# Altium integrated library MU_MP_39_V1.IntLib: 148 symbols (part 2 of 2)
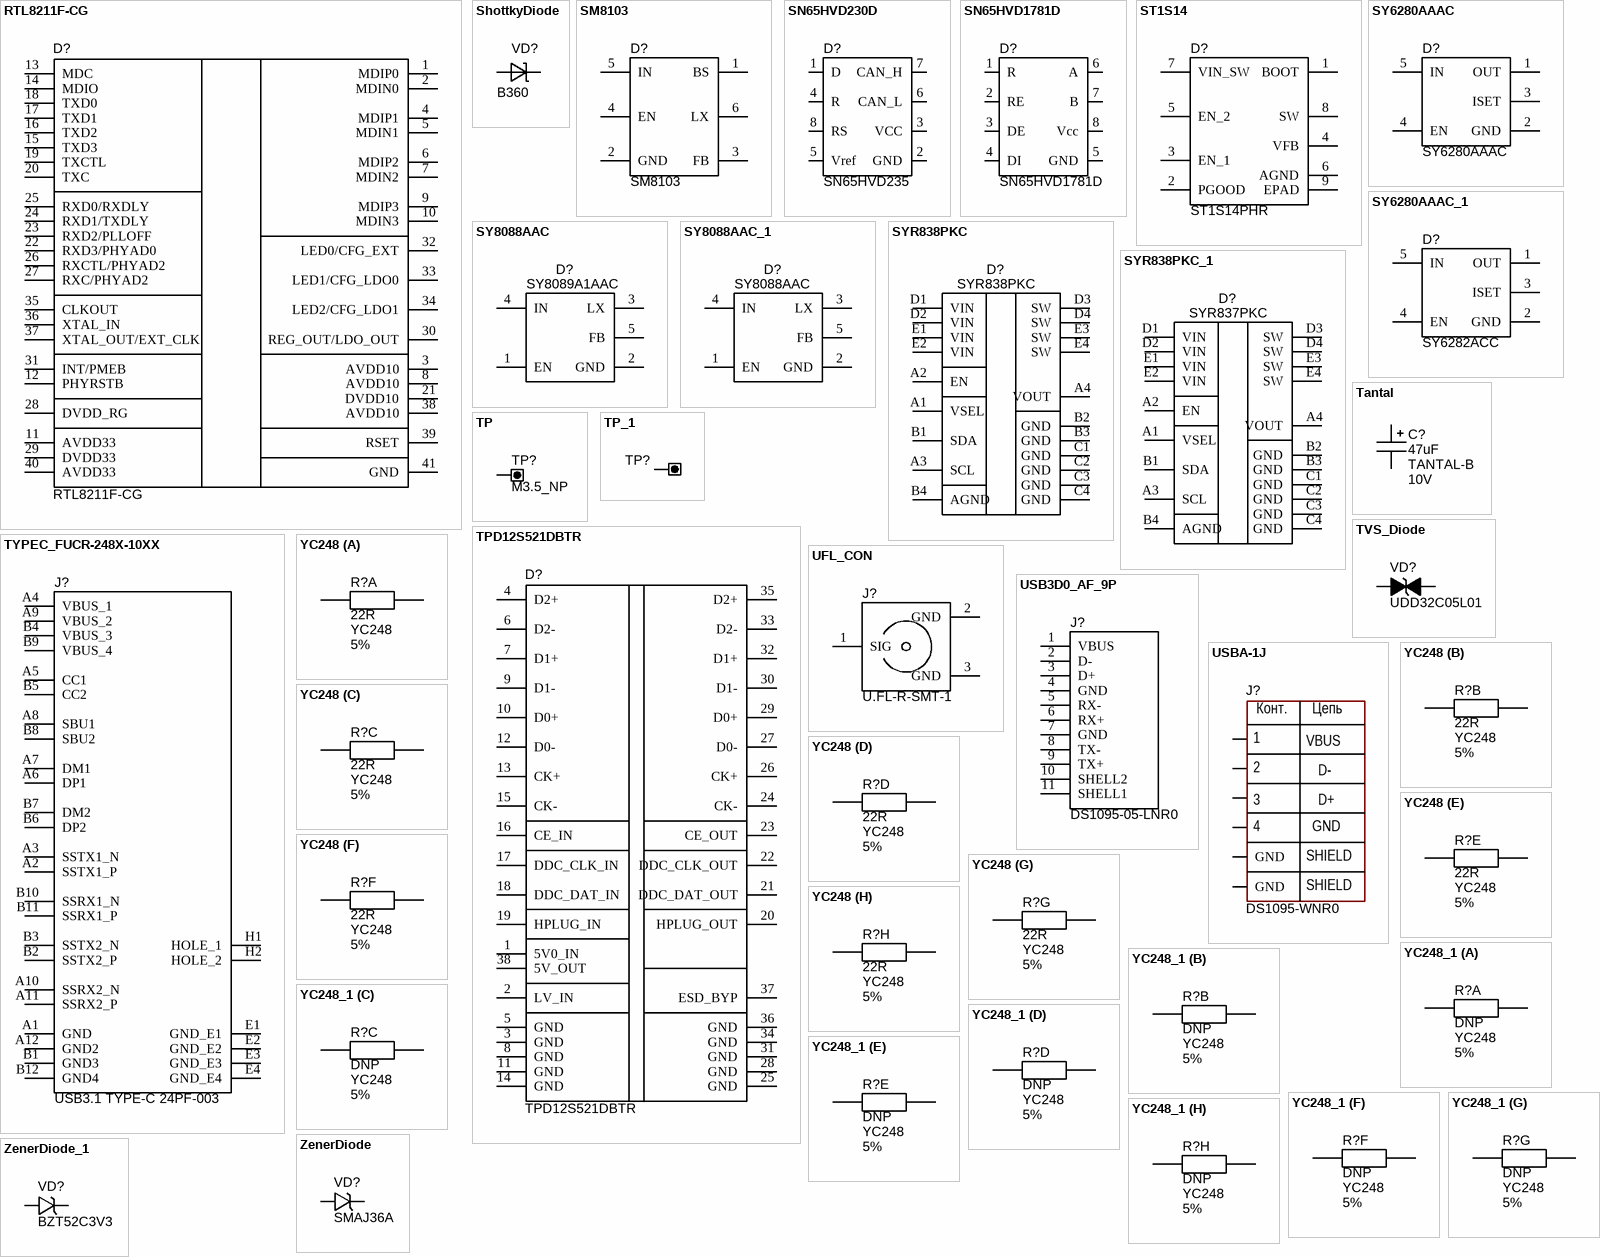
[diagram p14: symbols RTL8211F-CG to ZenerDiode_1]

## TYPEC_FUCR-248X-10XX
designator J?, comment USB3.1 TYPE-C 24PF-003
ComponentType: SMD Chip Resistor; Manufacter: *; Voltage: *; ClassName: *; Tolerance: *; PartNumber: USB3.1 TYPE-C 24PF-003; Package: USB3.1 TYPE-C 24PF-003; Value: USB3.1 TYPE-C 24PF-003
footprint USB3.1 TYPE-C 24PF-003
pins: A1 GND, A2 SSTX1_P, A3 SSTX1_N, A4 VBUS_1, A5 CC1, A6 DP1, A7 DM1, A8 SBU1, A9 VBUS_2, A10 SSRX2_N, A11 SSRX2_P, A12 GND2, B1 GND3, B2 SSTX2_P, B3 SSTX2_N, B4 VBUS_3, B5 CC2, B6 DP2, B7 DM2, B8 SBU2, B9 VBUS_4, B10 SSRX1_N, B11 SSRX1_P, B12 GND4, E1 GND_E1, E2 GND_E2, E3 GND_E3, E4 GND_E4, H1 HOLE_1, H2 HOLE_2

## UFL_CON
designator J?, comment U.FL-R-SMT-1
ComponentType: SMD Chip Resistor; Manufacter: *; Voltage: *; ClassName: *; Tolerance: *; PartNumber: U.FL-R-SMT-1; Package: U.FL-R-SMT-1; Value: U.FL-R-SMT-1
footprint U.FL-R-SMT-1
pins: 1 SIG, 2 GND, 3 GND

## USB3D0_AF_9P
designator J?, comment DS1095-05-LNR0
ComponentType: SMD Chip Resistor; Manufacter: *; Voltage: *; ClassName: *; Tolerance: *; PartNumber: DS1095-05-LNR0; Package: DS1095-05-LNR0; Value: DS1095-05-LNR0
footprint DS1095-05-LNR0
pins: 1 VBUS, 2 D-, 3 D+, 4 GND, 5 RX-, 6 RX+, 7 GND, 8 TX-, 9 TX+, 10 SHELL2, 11 SHELL1

## USBA-1J
designator J?, comment DS1095-WNR0
ComponentType: *; Manufacter: *; Package: DS1095-WNR0; PartNumber: DS1095-WNR0; Value: DS1095-WNR0
footprint USB-A-J1
footprint DS1095-WNR0
pins: 1, 2, 3, 4, S1 GND, S2 GND
text: Конт.; Цепь; VBUS; D-; D+; SHIELD

## YC248
designator R?, comment Package: YC248  Tolerance: 5%  (hidden comment: 22R)
PartNumber: YC248-JR-0722RL; ComponentType: *; Manufacter: *; ClassName: *; Value: 22R
footprint YC248
part A pins: 1, 16
part B pins: 2, 15
part C pins: 3, 14
part D pins: 4, 13
part E pins: 5, 12
part F pins: 6, 11
part G pins: 7, 10
part H pins: 8, 9

## YC248_1
designator R?, comment Package: YC248  Tolerance: 5%  (hidden comment: DNP)
PartNumber: Do Not Place; ComponentType: *; Manufacter: *; ClassName: *; Value: DNP
footprint YC248
part A pins: 1, 16
part B pins: 2, 15
part C pins: 3, 14
part D pins: 4, 13
part E pins: 5, 12
part F pins: 6, 11
part G pins: 7, 10
part H pins: 8, 9

## ZenerDiode
designator VD?, comment SMAJ36A
ComponentType: *; Manufacter: *; Package: SMA; PartNumber: SMAJ36A; ClassName: *; Value: SMAJ36A
footprint SOD323
footprint SMC
footprint SMA
pins: 1 A, 2 C

## ZenerDiode_1
designator VD?, comment BZT52C3V3
ComponentType: *; Manufacter: *; Package: SOD323; PartNumber: BZT52C3V3; ClassName: *; Value: BZT52C3V3
footprint SOD323
footprint SMC
pins: 1 A, 2 C